# Altium footprint library RES_TH.PcbLib: 94 footprints (part 2 of 6)
Each footprint in its own frame and in the unit in brackets; x right, y up, seen from the top. Pads: shape width x height; smd on the part's side, far side on the other; paste and mask are expansions set on the pad; w line width, h text height; cw(c..) or ccw(c..) is an arc to the next point about the centre after c.
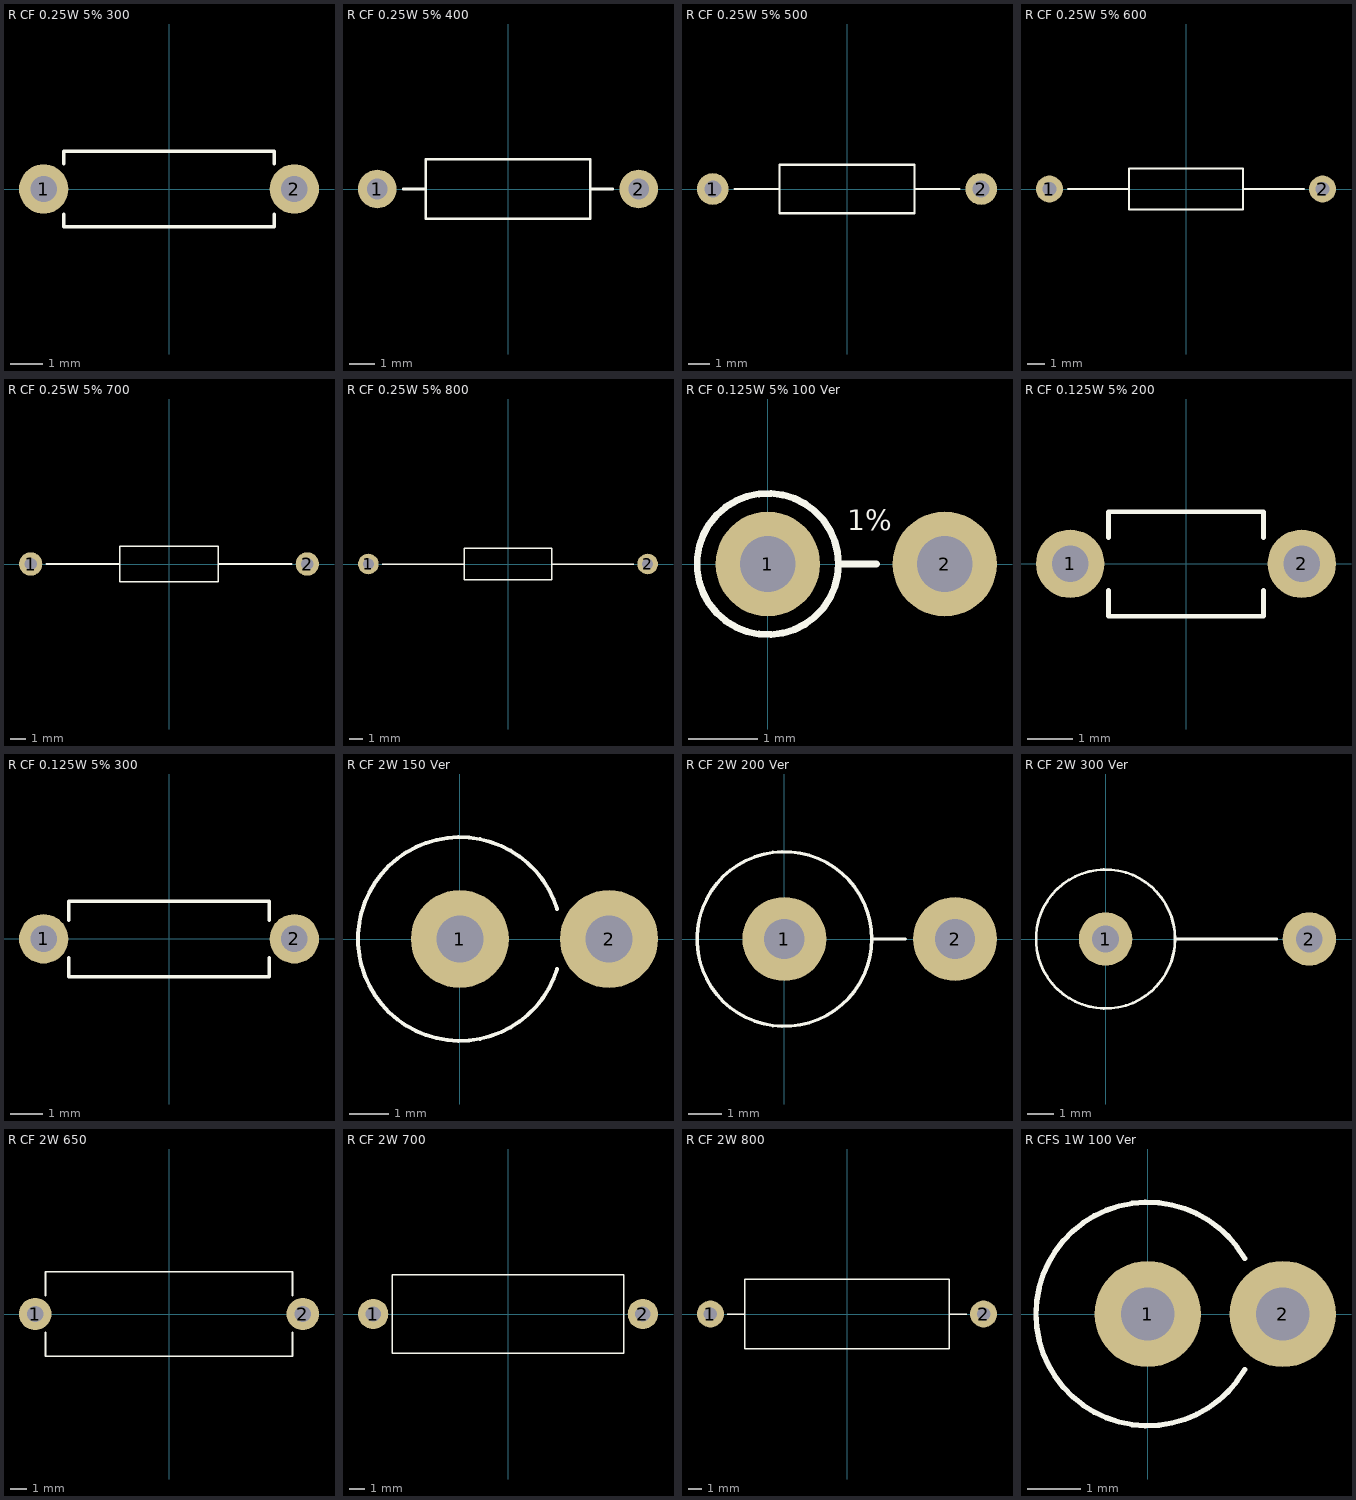
[diagram p1: the footprints below, top view; thin cyan lines are the x and y axes]

## R CF 0.25W 5% 300 [mm]
pads (2):
  round 1.5 hole 0.8: 1(-3.81,0) 2(3.81,0)
Top Overlay:
  lines w0.1: -3.2,-0.762 -3.2,-1.15 3.2,-1.15 3.2,-0.762 ; -3.2,0.762 -3.2,1.15 3.2,1.15 3.2,0.762
3D body "R0.25W 5% 300.SLDPRT": height 2.3, standoff -2.54, extent -4.11,-1.15 4.108,1.15

## R CF 0.25W 5% 400 [mm]
pads (2):
  round 1.5 hole 0.8: 1(-5.08,0) 2(5.08,0)
Top Overlay:
  lines w0.1: -4.064,0 -3.2,0 ; 3.2,0 4.064,0 ; -3.2,-1.15 -3.2,1.15 3.2,1.15 3.2,-1.15 -3.2,-1.15
3D body "R0.25W 5% 400.SLDPRT": height 2.3, standoff -2.54, extent -5.378,-1.15 5.378,1.15

## R CF 0.25W 5% 500 [mm]
pads (2):
  round 1.5 hole 0.8: 1(-6.35,0) 2(6.35,0)
Top Overlay:
  lines w0.1: -5.334,0 -3.2,0 ; 3.2,0 5.334,0 ; -3.2,-1.15 -3.2,1.15 3.2,1.15 3.2,-1.15 -3.2,-1.15
3D body "R0.25W 5% 500.SLDPRT": height 2.3, standoff -2.54, extent -6.648,-1.15 6.648,1.15

## R CF 0.25W 5% 600 [mm]
pads (2):
  round 1.5 hole 0.8: 1(-7.62,0) 2(7.62,0)
Top Overlay:
  lines w0.1: -6.604,0 -3.175,0 ; 3.2,0 6.604,0 ; -3.175,-1.15 -3.175,1.15 3.175,1.15 3.175,-1.15 -3.175,-1.15
3D body "R0.25W 5% 600.SLDPRT": height 2.3, standoff -2.54, extent -7.918,-1.15 7.918,1.15

## R CF 0.25W 5% 700 [mm]
pads (2):
  round 1.5 hole 0.8: 1(-8.89,0) 2(8.89,0)
Top Overlay:
  lines w0.1: -7.874,0 -3.175,0 ; 3.2,0 7.874,0 ; -3.175,-1.15 -3.175,1.15 3.175,1.15 3.175,-1.15 -3.175,-1.15
3D body "R0.25W 5% 700.SLDPRT": height 2.3, standoff -2.54, extent -9.188,-1.15 9.188,1.15

## R CF 0.25W 5% 800 [mm]
pads (2):
  round 1.5 hole 0.8: 1(-10.16,0) 2(10.16,0)
Top Overlay:
  lines w0.1: -9.144,0 -3.175,0 ; 3.2,0 9.144,0 ; -3.175,-1.15 -3.175,1.15 3.175,1.15 3.175,-1.15 -3.175,-1.15
3D body "R0.25W 5% 800.SLDPRT": height 2.3, standoff -2.54, extent -10.458,-1.15 10.458,1.15

## R CF 0.125W 5% 100 Ver [mm]
pads (2):
  round 1.5 hole 0.8: 1(0,0) 2(2.54,0)
Top Overlay:
  circle w0.1: c0,0 r1.016
  lines w0.1: 1.016,0 1.562,0
  text "1%" at 1.143,0.381 h0.5
3D body "R0.125W 5% 100 Ver.STEP": height 6.07, standoff -2.54, extent -1.15,-1.15 2.84,1.15

## R CF 0.125W 5% 200 [mm]
pads (2):
  round 1.5 hole 0.8: 1(-2.54,0) 2(2.54,0)
Top Overlay:
  lines w0.1: -1.7,-0.577 -1.7,-1.15 1.7,-1.15 1.7,-0.577 ; -1.7,0.568 -1.7,1.141 1.7,1.141 1.7,0.568
3D body "R0.125W 5% 200.SLDPRT": height 2.3, standoff -2.5, extent -2.839,-1.15 2.839,1.15

## R CF 0.125W 5% 300 [mm]
pads (2):
  round 1.5 hole 0.8: 1(-3.81,0) 2(3.81,0)
Top Overlay:
  lines w0.1: -3.048,-0.577 -3.048,-1.15 3.048,-1.15 3.048,-0.577 ; -3.048,0.568 -3.048,1.141 3.048,1.141 3.048,0.568
3D body "R0.125W 5% 300.SLDPRT": height 2.3, standoff -2.5, extent -4.11,-1.15 4.11,1.15

## R CF 2W 150 Ver [mm]
pads (2):
  round 2.5 hole 1.2: 1(0,0) 2(3.81,0)
Top Overlay:
  lines w0.1: 2.485,-0.765 cw(c0,0) 2.485,0.765
3D body "R2W CFS 150 Ver.SLDPRT": height 18.81, standoff -2.03, extent -2.613,-2.613 4.207,2.613

## R CF 2W 200 Ver [mm]
pads (2):
  round 2.5 hole 1.2: 1(0,0) 2(5.08,0)
Top Overlay:
  circle w0.1: c0,0 r2.6
  lines w0.1: 2.6,0 3.6,0
3D body "R2W CFS 200 Ver.SLDPRT": height 19.44, standoff -2.03, extent -2.613,-2.613 5.477,2.613

## R CF 2W 300 Ver [mm]
pads (2):
  round 2 hole 1: 1(0,0) 2(7.62,0)
Top Overlay:
  circle w0.1: c0,0 r2.6
  lines w0.1: 2.6,0 6.4,0
3D body "R2W CFS 300 Ver.SLDPRT": height 20.71, standoff -2.03, extent -2.613,-2.613 8.017,2.613

## R CF 2W 650 [mm]
pads (2):
  round 2 hole 1: 1(-8.255,0) 2(8.255,0)
Top Overlay:
  lines w0.1: -7.62,-1.12 -7.62,-2.6 7.62,-2.6 7.62,-1.12 ; -7.62,1.12 -7.62,2.6 7.62,2.6 7.62,1.12
3D body "R2W CFS 650.SLDPRT": height 5.2, standoff -2.54, extent -8.605,-2.6 8.605,2.6

## R CF 2W 700 [mm]
pads (2):
  round 2 hole 1: 1(-8.89,0) 2(8.89,0)
Top Overlay:
  lines w0.1: -7.62,-2.6 7.62,-2.6 7.62,2.6 -7.62,2.6 -7.62,-2.6
3D body "R2W CFS 700.SLDPRT": height 5.2, standoff -2.54, extent -9.24,-2.6 9.24,2.6

## R CF 2W 800 [mm]
pads (2):
  round 2 hole 1: 1(-10.16,0) 2(10.16,0)
Top Overlay:
  lines w0.1: -8.9,0 -7.62,0 ; 7.62,0 8.9,0 ; -7.62,-2.6 7.62,-2.6 7.62,2.6 -7.62,2.6 -7.62,-2.6
3D body "R2W CFS 800.SLDPRT": height 5.2, standoff -2.54, extent -10.51,-2.6 10.51,2.6

## R CFS 1W 100 Ver [mm]
pads (2):
  round 2 hole 1: 1(0,0) 2(2.54,0)
Top Overlay:
  lines w0.1: 1.823,-1.042 cw(c0,0) 1.823,1.042
3D body "R1W CFS 100 Ver.STEP": height 14.08, standoff -2.03, extent -2.1,-2.1 2.84,2.1